# Altium footprint library Wurth_Elektronik_Electromechanic_Wire_to_Board_Connectors_rev16a.PCBLIB: 662 footprints (part 21 of 42)
Each footprint in its own frame and in the unit in brackets; x right, y up, seen from the top. Pads: shape width x height; smd on the part's side, far side on the other; paste and mask are expansions set on the pad; w line width, h text height; cw(c..) or ccw(c..) is an arc to the next point about the centre after c.
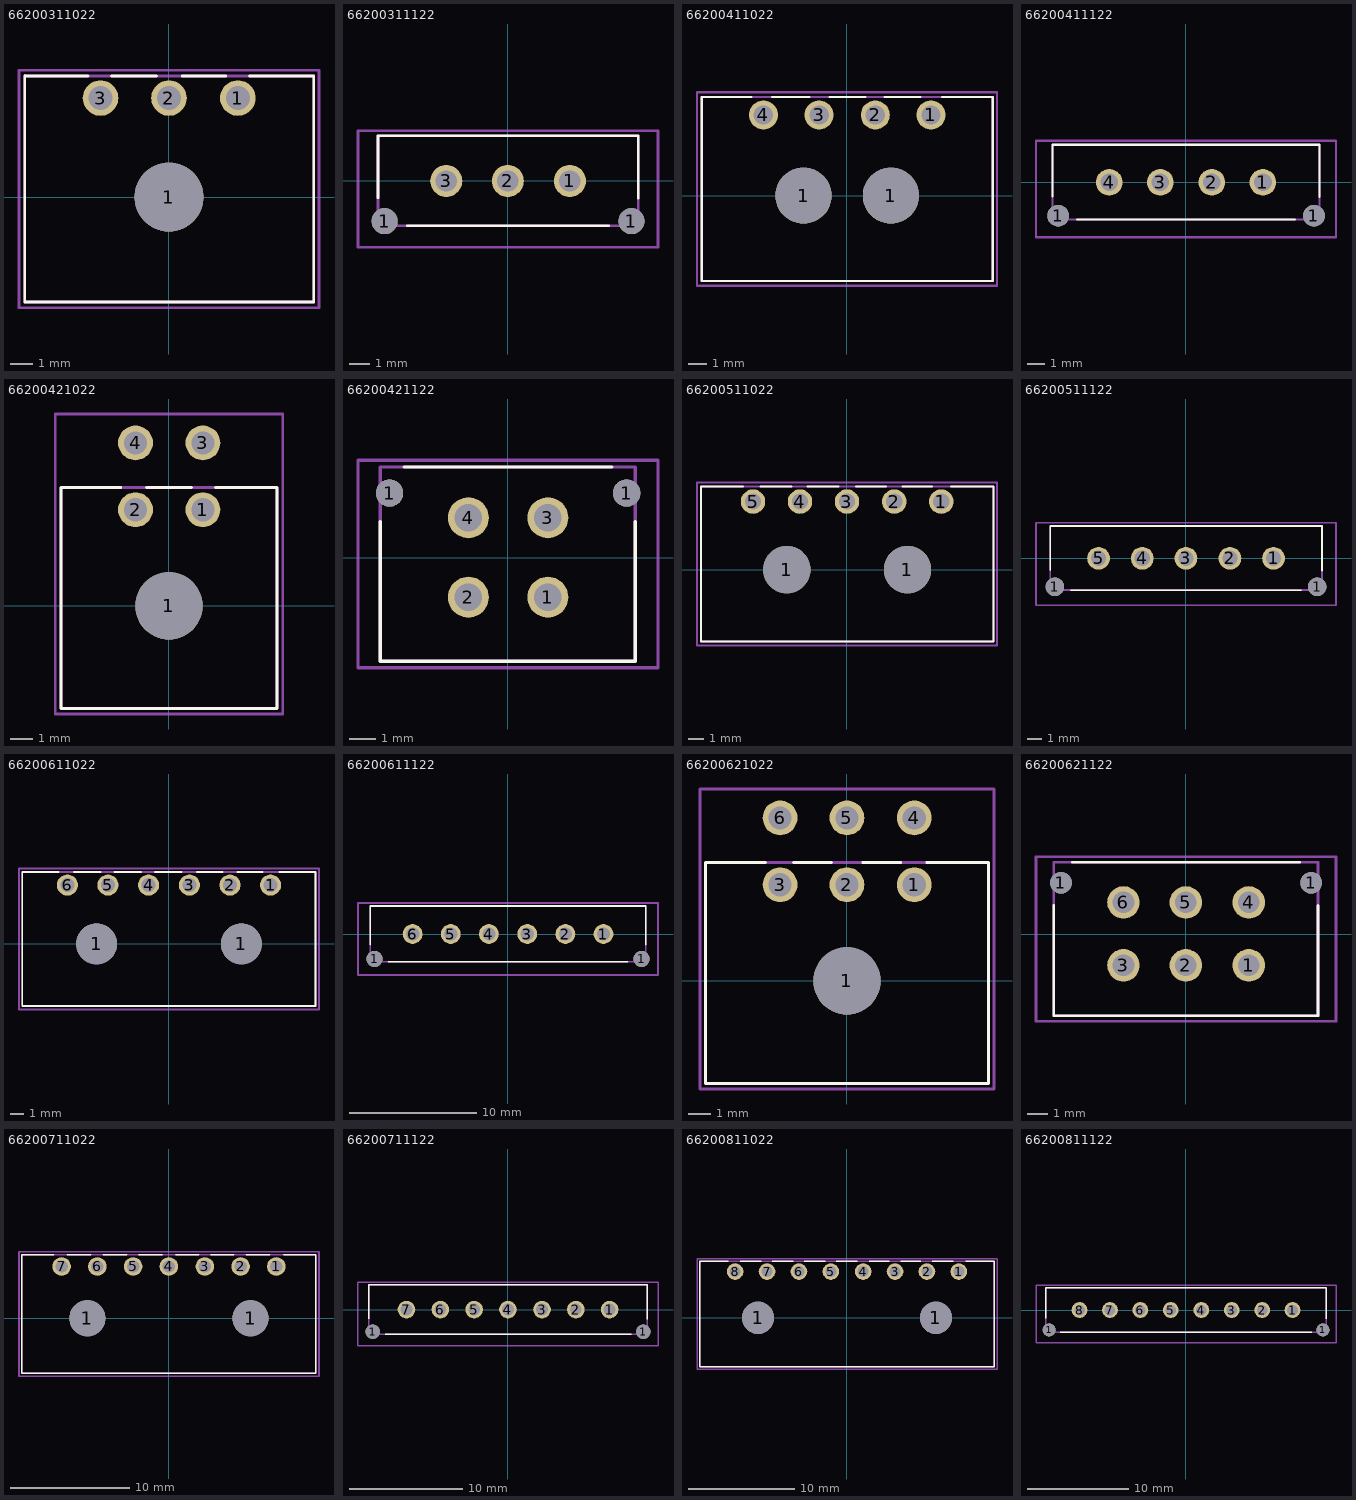
[diagram p20: the footprints below, top view; thin cyan lines are the x and y axes]

## 66200311022 [mil]
pads (4):
  round 119 hole 119: 1(0,0)
  round 61.5 hole 41: 1(119,171) 2(0,171) 3(-118.11,171)
Top Overlay:
  lines w5: -249.02,209 -249.02,-181.1 250,-181.1 250,209 139,209 ; -248.82,210 -248.82,209 -139.76,209 ; -99.21,209 -21.26,209 ; 23,209 98,209
Mechanical 2:
  text ">NAME" at 310,21 h77.5
Mechanical 4:
  text ">VALUE" at 310,-54.92 h77.5
Mechanical 16:
  lines w5: -249.02,-181.1 250,-181.1 250,209 -249.02,209 -249.02,-181.1
  text "1" at 100,146 h77.5
  text "3" at -125,146 h77.5
Mechanical 27:
  lines w5: -258.86,-190.94 259,-190.94 259,219 -258.86,219 -258.86,-190.94

## 66200311122 [mil]
pads (5):
  round 50 hole 50: 1(-236.22,-77.17) 1(237,-77.17)
  round 61.5 hole 41: 1(119,0) 2(0,0) 3(-118.11,0)
Top Overlay:
  lines w5: -249.02,-32.48 -249.02,87 250,87 250,-33.27 ; -192.91,-86.22 193,-86.22
Mechanical 2:
  text ">NAME" at 315,16 h77.5
Mechanical 4:
  text ">VALUE" at 308,-66.93 h77.5
Mechanical 16:
  lines w5: -249.02,-86.02 250,-86.02 250,87 -249.02,87 -249.02,-86.02
  text "1" at 99,-19.68 h77.5
  text "3" at -144.69,-23.62 h77.5
Mechanical 27:
  lines w5: -287.4,-126.77 288,-126.77 288,96 -287.4,96 -287.4,-126.77

## 66200411022 [mil]
pads (6):
  round 119 hole 119: 1(-92.13,0) 1(93,0)
  round 61.5 hole 41: 1(178,171) 2(60,171) 3(-59.06,171) 4(-177.17,171)
Top Overlay:
  lines w5: -308.07,209 -308.07,-181.1 309,-181.1 309,209 ; -307.09,209 -202.76,209 ; -158.27,209 -80.31,209 ; -36.22,209 39,209 ; 80,209 155,209 ; 202,209 308,209
Mechanical 2:
  text ">NAME" at 369,21 h77.5
Mechanical 4:
  text ">VALUE" at 369,-54.92 h77.5
Mechanical 16:
  lines w5: -308.07,-181.1 309,-181.1 309,209 -308.07,209 -308.07,-181.1
  text "1" at 182,146 h77.5
  text "4" at -184.06,146 h77.5
Mechanical 27:
  lines w5: -317.91,-190.94 318,-190.94 318,219 -317.91,219 -317.91,-190.94

## 66200411122 [mil]
pads (6):
  round 50 hole 50: 1(-295.28,-77.17) 1(296,-77.17)
  round 61.5 hole 41: 1(178,0) 2(60,0) 3(-59.06,0) 4(-177.17,0)
Top Overlay:
  lines w5: -308.07,-32.48 -308.07,87 309,87 309,-33.27 ; -251.97,-86.22 252,-86.22
Mechanical 2:
  text ">NAME" at 375,16 h77.5
Mechanical 4:
  text ">VALUE" at 367,-66.93 h77.5
Mechanical 16:
  lines w5: -308.07,-86.02 309,-86.02 309,87 -308.07,87 -308.07,-86.02
  text "1" at 158,-19.68 h77.5
  text "4" at -185.63,-23.62 h77.5
Mechanical 27:
  lines w5: -346.46,-126.77 347,-126.77 347,96 -346.46,96 -346.46,-126.77

## 66200421022 [mil]
pads (5):
  round 119 hole 119: 1(0,0)
  round 61.5 hole 41: 1(60,170) 2(-59.06,170) 3(60,288) 4(-59.06,288)
Top Overlay:
  lines w5: -85.04,209 -190.94,209 -190.94,-181.1 191,-181.1 191,209 82,209 ; -39.37,209 40,209
Mechanical 2:
  text ">NAME" at 260,104 h77.5
Mechanical 4:
  text ">VALUE" at 260,29 h77.5
Mechanical 16:
  lines w5: -190.94,-181.1 191,-181.1 191,209 -190.94,209 -190.94,-181.1
  text "1" at 35,154 h77.5
  text "4" at -65.94,254 h77.5
Mechanical 27:
  lines w5: -200.79,-190.94 201,-190.94 201,339 -200.79,339 -200.79,-190.94

## 66200421122 [mil]
pads (6):
  round 41 hole 41: 1(-177.17,97) 1(178,97)
  round 61.5 hole 41: 1(60,-59.06) 2(-59.06,-59.06) 3(60,60) 4(-59.06,60)
Top Overlay:
  lines w5: -190.94,54 -190.94,-154.72 191,-154.72 ; -155.51,136 156,136 ; 191,-155.12 191,-154.72 ; 191,54 191,-154.72
Mechanical 2:
  text ">NAME" at -526.57,0 h77.5
Mechanical 4:
  text ">VALUE" at -557.28,-91.14 h77.5
Mechanical 16:
  lines w5: -190.94,-154.72 -190.94,136 191,136 191,-154.72 -190.94,-154.72
  text "1" at 35,-75 h77.5
  text "4" at -65.94,25 h77.5
Mechanical 27:
  lines w5: -224.41,-164.57 225,-164.57 225,146 -224.41,146 -224.41,-164.57

## 66200511022 [mil]
pads (7):
  round 119 hole 119: 1(-151.18,0) 1(152,0)
  round 61.5 hole 41: 1(237,171) 2(119,171) 3(0,171) 4(-118.11,171) 5(-236.22,171)
Top Overlay:
  lines w5: -367.13,209 -367.13,-181.1 368,-181.1 368,209 ; -366.14,209 -261.81,209 ; -217.32,209 -139.37,209 ; -99.21,209 -21.26,209 ; 23,209 98,209 ; 139,209 214,209 ; 262,209 367,209
Mechanical 2:
  text ">NAME" at 428,21 h77.5
Mechanical 4:
  text ">VALUE" at 428,-54.92 h77.5
Mechanical 16:
  lines w5: -367.13,-181.1 368,-181.1 368,209 -367.13,209 -367.13,-181.1
  text "1" at 241,146 h77.5
  text "5" at -243.11,146 h77.5
Mechanical 27:
  lines w5: -376.97,-190.94 377,-190.94 377,219 -376.97,219 -376.97,-190.94

## 66200511122 [mil]
pads (7):
  round 50 hole 50: 1(-354.33,-77.17) 1(355,-77.17)
  round 61.5 hole 41: 1(237,0) 2(119,0) 3(0,0) 4(-118.11,0) 5(-236.22,0)
Top Overlay:
  lines w5: -367.13,-32.48 -367.13,87 368,87 368,-33.27 ; -311.02,-86.22 312,-86.22
Mechanical 2:
  text ">NAME" at 434,16 h77.5
Mechanical 4:
  text ">VALUE" at 426,-66.93 h77.5
Mechanical 16:
  lines w5: -367.13,-86.02 368,-86.02 368,87 -367.13,87 -367.13,-86.02
  text "1" at 217,-19.68 h77.5
  text "5" at -251.57,-23.62 h77.5
Mechanical 27:
  lines w5: -405.51,-126.77 406,-126.77 406,96 -405.51,96 -405.51,-126.77

## 66200611022 [mil]
pads (8):
  round 119 hole 119: 1(-210.24,0) 1(211,0)
  round 61.5 hole 41: 1(296,171) 2(178,171) 3(60,171) 4(-59.06,171) 5(-177.17,171) 6(-295.28,171)
Top Overlay:
  lines w5: -426.18,209 -426.18,-181.1 427,-181.1 427,209 ; -425.2,209 -320.87,209 ; -276.38,209 -198.43,209 ; -158.27,209 -80.31,209 ; -40.16,209 38,209 ; 82,209 157,209 ; 199,209 273,209 ; 321,209 426,209
Mechanical 2:
  text ">NAME" at 487,21 h77.5
Mechanical 4:
  text ">VALUE" at 487,-54.92 h77.5
Mechanical 16:
  lines w5: -426.18,-181.1 427,-181.1 427,209 -426.18,209 -426.18,-181.1
  text "1" at 300,146 h77.5
  text "6" at -302.17,146 h77.5
Mechanical 27:
  lines w5: -436.02,-190.94 437,-190.94 437,219 -436.02,219 -436.02,-190.94

## 66200611122 [mil]
pads (8):
  round 50 hole 50: 1(-413.39,-77.17) 1(414,-77.17)
  round 61.5 hole 41: 1(296,0) 2(178,0) 3(60,0) 4(-59.06,0) 5(-177.17,0) 6(-295.28,0)
Top Overlay:
  lines w5: -426.18,-32.48 -426.18,87 427,87 427,-33.27 ; -370.08,-86.22 371,-86.22
Mechanical 2:
  text ">NAME" at 493,16 h77.5
Mechanical 4:
  text ">VALUE" at 485,-66.93 h77.5
Mechanical 16:
  lines w5: -426.18,-86.02 427,-86.02 427,87 -426.18,87 -426.18,-86.02
  text "1" at 276,-19.68 h77.5
  text "6" at -318.11,-27.17 h77.5
Mechanical 27:
  lines w5: -464.57,-126.77 465,-126.77 465,96 -464.57,96 -464.57,-126.77

## 66200621022 [mil]
pads (7):
  round 119 hole 119: 1(0,0)
  round 61.5 hole 41: 1(119,170) 2(0,170) 3(-118.11,170) 4(119,288) 5(0,288) 6(-118.11,288)
Top Overlay:
  lines w5: -144.09,209 -250,209 -250,-181.1 250,-181.1 250,209 141,209 ; -94.49,209 -27.56,209 ; 28,209 95,209
Mechanical 2:
  text ">NAME" at 319,104 h77.5
Mechanical 4:
  text ">VALUE" at 319,29 h77.5
Mechanical 16:
  lines w5: -250,-181.1 250,-181.1 250,209 -250,209 -250,-181.1
  text "1" at 94,154 h77.5
  text "6" at -131.89,254 h77.5
Mechanical 27:
  lines w5: -259.84,-190.94 260,-190.94 260,339 -259.84,339 -259.84,-190.94

## 66200621122 [mil]
pads (8):
  round 41 hole 41: 1(-236.22,97) 1(237,97)
  round 61.5 hole 41: 1(119,-59.06) 2(0,-59.06) 3(-118.11,-59.06) 4(119,60) 5(0,60) 6(-118.11,60)
Top Overlay:
  lines w5: -250,54 -250,-154.72 250,-154.72 250,54 ; -214.57,136 215,136
Mechanical 2:
  text ">NAME" at -592.52,0 h77.5
Mechanical 4:
  text ">VALUE" at -598.23,-91.14 h77.5
Mechanical 16:
  lines w5: -250,-154.72 -250,136 250,136 250,-154.72 -250,-154.72
  text "1" at 94,-75 h77.5
  text "6" at -131.89,50 h77.5
Mechanical 27:
  lines w5: -283.46,-164.57 284,-164.57 284,146 -283.46,146 -283.46,-164.57

## 66200711022 [mil]
pads (9):
  round 119 hole 119: 1(-269.29,0) 1(270,0)
  round 61.5 hole 41: 1(355,171) 2(237,171) 3(119,171) 4(0,171) 5(-118.11,171) 6(-236.22,171) 7(-354.33,171)
Top Overlay:
  lines w5: -485.24,209 -485.24,-181.1 486,-181.1 486,209 ; -484.25,209 -379.92,209 ; -335.43,209 -257.48,209 ; -217.32,209 -139.37,209 ; -99.21,209 -21.26,209 ; 23,209 98,209 ; 139,209 214,209 ; 256,209 334,209 ; 380,209 485,209
Mechanical 2:
  text ">NAME" at 546,21 h77.5
Mechanical 4:
  text ">VALUE" at 546,-54.92 h77.5
Mechanical 16:
  lines w5: -485.24,-181.1 486,-181.1 486,209 -485.24,209 -485.24,-181.1
  text "7" at -406.5,146 h77.5
  text "1" at 300,146 h77.5
Mechanical 27:
  lines w5: -495.08,-190.94 496,-190.94 496,219 -495.08,219 -495.08,-190.94

## 66200711122 [mil]
pads (9):
  round 50 hole 50: 1(-472.44,-77.17) 1(473,-77.17)
  round 61.5 hole 41: 1(355,0) 2(237,0) 3(119,0) 4(0,0) 5(-118.11,0) 6(-236.22,0) 7(-354.33,0)
Top Overlay:
  lines w5: -485.24,-32.48 -485.24,87 486,87 486,-33.27 ; -429.13,-86.22 430,-86.22
Mechanical 2:
  text ">NAME" at 552,16 h77.5
Mechanical 4:
  text ">VALUE" at 544,-66.93 h77.5
Mechanical 16:
  lines w5: -485.24,-86.02 486,-86.02 486,87 -485.24,87 -485.24,-86.02
  text "1" at 335,-19.68 h77.5
  text "7" at -359.06,-27.17 h77.5
Mechanical 27:
  lines w5: -523.62,-126.77 524,-126.77 524,96 -523.62,96 -523.62,-126.77

## 66200811022 [mil]
pads (10):
  round 119 hole 119: 1(-328.35,0) 1(329,0)
  round 61.5 hole 41: 1(414,171) 2(296,171) 3(178,171) 4(60,171) 5(-59.06,171) 6(-177.17,171) 7(-295.28,171) 8(-413.39,171)
Top Overlay:
  lines w5: -544.29,209 -544.29,-181.1 545,-181.1 545,209 ; -543.31,209 -438.98,209 ; -394.49,209 -316.54,209 ; -276.38,209 -198.43,209 ; -158.27,209 -80.31,209 ; -40.16,209 38,209 ; 82,209 157,209 ; 199,209 273,209 ; 315,209 393,209 ; 439,209 544,209
Mechanical 2:
  text ">NAME" at 605,21 h77.5
Mechanical 4:
  text ">VALUE" at 605,-54.92 h77.5
Mechanical 16:
  lines w5: -544.29,-181.1 545,-181.1 545,209 -544.29,209 -544.29,-181.1
  text "8" at -406.5,146 h77.5
  text "1" at 418,146 h77.5
Mechanical 27:
  lines w5: -554.13,-190.94 555,-190.94 555,219 -554.13,219 -554.13,-190.94

## 66200811122 [mil]
pads (10):
  round 50 hole 50: 1(-531.5,-77.17) 1(532,-77.17)
  round 61.5 hole 41: 1(414,0) 2(296,0) 3(178,0) 4(60,0) 5(-59.06,0) 6(-177.17,0) 7(-295.28,0) 8(-413.39,0)
Top Overlay:
  lines w5: -544.29,-32.48 -544.29,87 545,87 545,-33.27 ; -488.19,-86.22 489,-86.22
Mechanical 2:
  text ">NAME" at 611,16 h77.5
Mechanical 4:
  text ">VALUE" at 603,-66.93 h77.5
Mechanical 16:
  lines w5: -544.29,-86.02 545,-86.02 545,87 -544.29,87 -544.29,-86.02
  text "1" at 394,-19.68 h77.5
  text "8" at -425,-27.17 h77.5
Mechanical 27:
  lines w5: -582.68,-126.77 583,-126.77 583,96 -582.68,96 -582.68,-126.77